# Altium footprint library Connector.PcbLib: 536 footprints (part 32 of 34)
Each footprint in its own frame and in the unit in brackets; x right, y up, seen from the top. Pads: shape width x height; smd on the part's side, far side on the other; paste and mask are expansions set on the pad; w line width, h text height; cw(c..) or ccw(c..) is an arc to the next point about the centre after c.
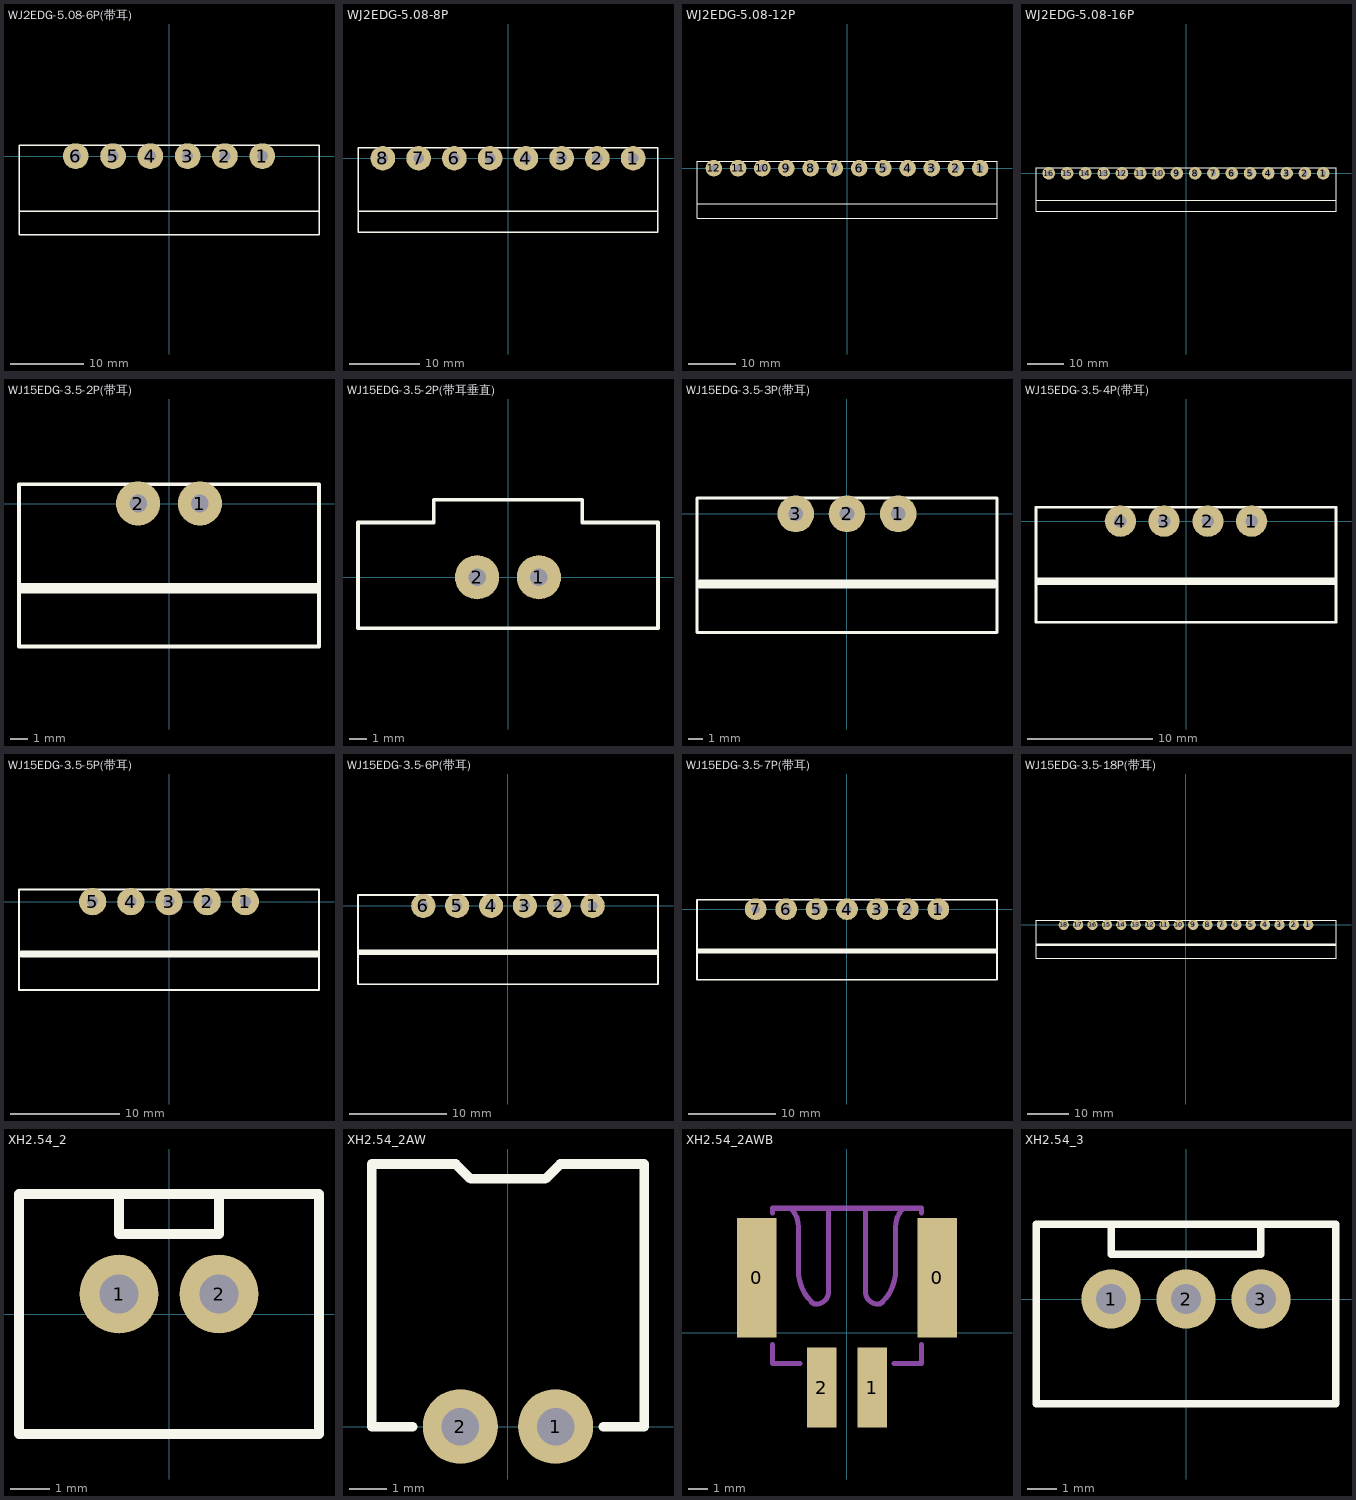
[diagram p31: the footprints below, top view; thin cyan lines are the x and y axes]

## WJ2EDG-5.08-6P(带耳) [mm]
height 8.2
pads (6):
  round 3.5 hole 1.5: 1(12.7,0) 2(7.62,0) 3(2.54,0) 4(-2.54,0) 5(-7.62,0) 6(-12.7,0)
Top Overlay:
  lines w0.203: -20.422,-7.5 20.42,-7.5 ; -20.42,-10.7 20.42,-10.7 ; -20.42,-10.693 -20.42,1.5 20.42,1.5 20.42,-10.693
3D body: height 8.4, standoff 0, extent -20.42,-10.7 20.42,1.5

## WJ2EDG-5.08-8P [mm]
height 8.2
pads (8):
  round 3.5 hole 1.5: 1(17.78,0) 2(12.7,0) 3(7.62,0) 4(2.54,0) 5(-2.54,0) 6(-7.62,0) 7(-12.7,0) 8(-17.78,0)
Top Overlay:
  lines w0.203: -21.311,1.5 -21.311,-10.49 21.311,-10.49 21.311,1.5 -21.285,1.5 ; -21.285,-7.5 21.311,-7.5
3D body "5.08mm-08 way.stp": height 8.6, standoff -3.5, extent -21.31,-10.5 21.33,1.502

## WJ2EDG-5.08-12P [mm]
height 8.2
pads (12):
  round 3.5 hole 1.5: 1(27.94,0) 2(22.86,0) 3(17.78,0) 4(12.7,0) 5(7.62,0) 6(2.54,0) 7(-2.54,0) 8(-7.62,0) 9(-12.7,0) 10(-17.78,0) 11(-22.86,0) 12(-27.94,0)
Top Overlay:
  lines w0.203: -31.471,-7.5 31.471,-7.5 ; -31.471,-10.49 -31.471,1.5 31.471,1.5 31.471,-10.49 -31.471,-10.49
3D body "5.08mm-12 way.stp": height 8.6, standoff -3.5, extent -31.47,-10.5 31.49,1.502

## WJ2EDG-5.08-16P [mm]
height 8.2
pads (16):
  round 3.5 hole 1.5: 1(38.1,0) 2(33.02,0) 3(27.94,0) 4(22.86,0) 5(17.78,0) 6(12.7,0) 7(7.62,0) 8(2.54,0) 9(-2.54,0) 10(-7.62,0) 11(-12.7,0) 12(-17.78,0) 13(-22.86,0) 14(-27.94,0) 15(-33.02,0) 16(-38.1,0)
Top Overlay:
  lines w0.203: -41.631,-7.5 41.631,-7.5 ; -41.631,-10.49 41.631,-10.49 41.631,1.5 -41.631,1.5 -41.631,-10.49
3D body "5.08mm-16 way.stp": height 8.6, standoff -3.5, extent -41.64,-10.5 41.64,1.502

## WJ15EDG-3.5-2P(带耳) [mm]
height 7
pads (2):
  round 2.5 hole 1: 1(1.75,0) 2(-1.75,0)
Top Overlay:
  lines w0.203: -8.5,-8.1 -8.5,1.1 8.5,1.1 8.5,-8.1 -8.5,-8.1
  lines w0.6: -8.28,-4.8 8.28,-4.8
3D body: height 7.4, standoff 0, extent -8.5,-8 8.5,1.1

## WJ15EDG-3.5-2P(带耳垂直) [mm]
height 7
pads (2):
  round 2.5 hole 1: 1(1.75,0) 2(-1.75,0)
Top Overlay:
  lines w0.203: -8.5,-2.9 8.5,-2.9 8.5,3.1 4.2,3.1 4.2,4.4 -4.2,4.4 -4.2,3.1 -8.5,3.1 -8.5,-2.9
3D body: height 9.2, standoff 0, extent -8.5,-2.9 8.5,3.1
3D body: height 9.2, standoff 0, extent -4.2,3.1 4.2,4.424

## WJ15EDG-3.5-3P(带耳) [mm]
height 7
pads (3):
  round 2.5 hole 1: 1(3.5,0) 2(0,0) 3(-3.5,0)
Top Overlay:
  lines w0.203: -10.25,-8.1 10.25,-8.1 10.25,1.1 -10.25,1.1 -10.25,-8.1
  lines w0.6: -10.033,-4.8 10.03,-4.8
3D body: height 7.4, standoff 0, extent -10.25,-8 10.25,1.1

## WJ15EDG-3.5-4P(带耳) [mm]
height 7
pads (4):
  round 2.5 hole 1: 1(5.25,0) 2(1.75,0) 3(-1.75,0) 4(-5.25,0)
Top Overlay:
  lines w0.203: -12,-8.1 -12,1.1 12,1.1 12,-8.1 -12,-8.1
  lines w0.6: -11.786,-4.8 11.78,-4.8
3D body: height 7.4, standoff 0, extent -12,-8 12,1.1

## WJ15EDG-3.5-5P(带耳) [mm]
height 7
pads (5):
  round 2.5 hole 1: 1(7,0) 2(3.5,0) 3(0,0) 4(-3.5,0) 5(-7,0)
Top Overlay:
  lines w0.203: -13.75,-8.1 13.75,-8.1 13.75,1.1 -13.75,1.1 -13.75,-8.1
  lines w0.6: -13.513,-4.8 13.53,-4.8
3D body: height 7.4, standoff 0, extent -13.75,-8 13.75,1.1

## WJ15EDG-3.5-6P(带耳) [mm]
height 7
pads (6):
  round 2.5 hole 1: 1(8.75,0) 2(5.25,0) 3(1.75,0) 4(-1.75,0) 5(-5.25,0) 6(-8.75,0)
Top Overlay:
  lines w0.203: -15.5,-8.1 -15.5,1.1 15.5,1.1 15.5,-8.1 -15.5,-8.1
  lines w0.6: -15.293,-4.8 15.28,-4.8
3D body: height 7.4, standoff 0, extent -15.5,-8 15.5,1.1

## WJ15EDG-3.5-7P(带耳) [mm]
height 7
pads (7):
  round 2.5 hole 1: 1(10.5,0) 2(7,0) 3(3.5,0) 4(0,0) 5(-3.5,0) 6(-7,0) 7(-10.5,0)
Top Overlay:
  lines w0.203: -17.25,-8.1 -17.25,1.1 17.25,1.1 17.25,-8.1 -17.25,-8.1
  lines w0.6: -17.046,-4.8 17.03,-4.8
3D body: height 7.4, standoff 0, extent -17.25,-8 17.25,1.1

## WJ15EDG-3.5-18P(带耳) [mm]
height 7
pads (18):
  round 2.5 hole 1: 1(29.75,0) 2(26.25,0) 3(22.75,0) 4(19.25,0) 5(15.75,0) 6(12.25,0) 7(8.75,0) 8(5.25,0) 9(1.75,0) 10(-1.75,0) 11(-5.25,0) 12(-8.75,0) 13(-12.25,0) 14(-15.75,0) 15(-19.25,0) 16(-22.75,0) 17(-26.25,0) 18(-29.75,0)
Top Overlay:
  lines w0.203: -36.5,-8.1 36.5,-8.1 36.5,1.1 -36.5,1.1 -36.5,-8.1
  lines w0.6: -36.3,-4.8 36.28,-4.8
3D body: height 7.4, standoff 0, extent -36.5,-8 36.5,1.1

## XH2.54_2 [mm]
pads (2):
  round 2 hole 1: 1(-1.27,0.508) 2(1.27,0.508)
Top Overlay:
  lines w0.254: -1.27,3.048 -1.27,2.54 -1.27,2.032 1.27,2.032 1.27,3.048 ; -3.81,-3.048 -3.81,3.048 3.81,3.048 3.81,0 3.81,-3.048 -3.81,-3.048
3D body "User Library-XH-A-2 .STEP": height 7.05, standoff -3.35, extent -3.7,-2.845 3.7,3.255

## XH2.54_2AW [mm]
pads (2):
  round 2 hole 1: 1(1.27,0) 2(-1.27,0)
Top Overlay:
  lines w0.254: -3.632,7 -3.632,0 -2.54,0 ; -3.632,7.004 -1.4,7.004 -1,6.604 1,6.604 1.4,7.004 3.628,7.004 3.632,7 3.632,0 2.54,0
3D body "User Library-XH-A-2 .STEP": height 6.1, standoff 0, extent -3.7,-3.269 3.7,7.131

## XH2.54_2AWB [mm]
pads (4):
  rect 2x6 smd: 0(-4.53,2.75) 0(4.53,2.75)
  rect 1.5x4 smd: 1(1.27,-2.75) 2(-1.27,-2.75)
Mechanical 15:
  lines w0.254: -3.73,-0.591 -3.73,-1.55 -2.366,-1.55 ; -3.73,6.013 -3.73,6.25 0,6.25 3.73,6.25 3.73,6.013 ; -2.823,6.25 cw(c-3.743,5.33) -2.442,5.33 -2.442,3.154 ccw(c-0.147,3.154) -1.77,1.531 ccw(c-1.553,1.748) -1.553,1.441 ccw(c-1.553,2.076) -0.918,2.076 -0.918,6.25 ; 0.918,6.25 0.918,2.076 ccw(c1.553,2.076) 1.553,1.441 ccw(c1.553,1.748) 1.77,1.531 ccw(c0.147,3.154) 2.442,3.154 2.442,5.33 cw(c3.743,5.33) 2.823,6.25 ; 2.366,-1.55 3.73,-1.55 3.73,-0.591

## XH2.54_3 [mm]
pads (3):
  round 2 hole 1: 1(-2.54,0) 2(0,0) 3(2.54,0)
Top Overlay:
  lines w0.254: -2.54,2.54 -2.54,1.524 2.54,1.524 2.54,2.54 ; -5.08,-3.556 -5.08,2.54 5.08,2.54 5.08,-0.508 5.08,-3.556 -5.08,-3.556
3D body "User Library-XH-A-3.STEP": height 7.05, standoff -3.35, extent -4.95,-3.327 4.95,2.773